# Altium footprint library komponenty_ITS_v1.PcbLib: 81 footprints (part 2 of 6)
Each footprint in its own frame and in the unit in brackets; x right, y up, seen from the top. Pads: shape width x height; smd on the part's side, far side on the other; paste and mask are expansions set on the pad; w line width, h text height; cw(c..) or ccw(c..) is an arc to the next point about the centre after c.
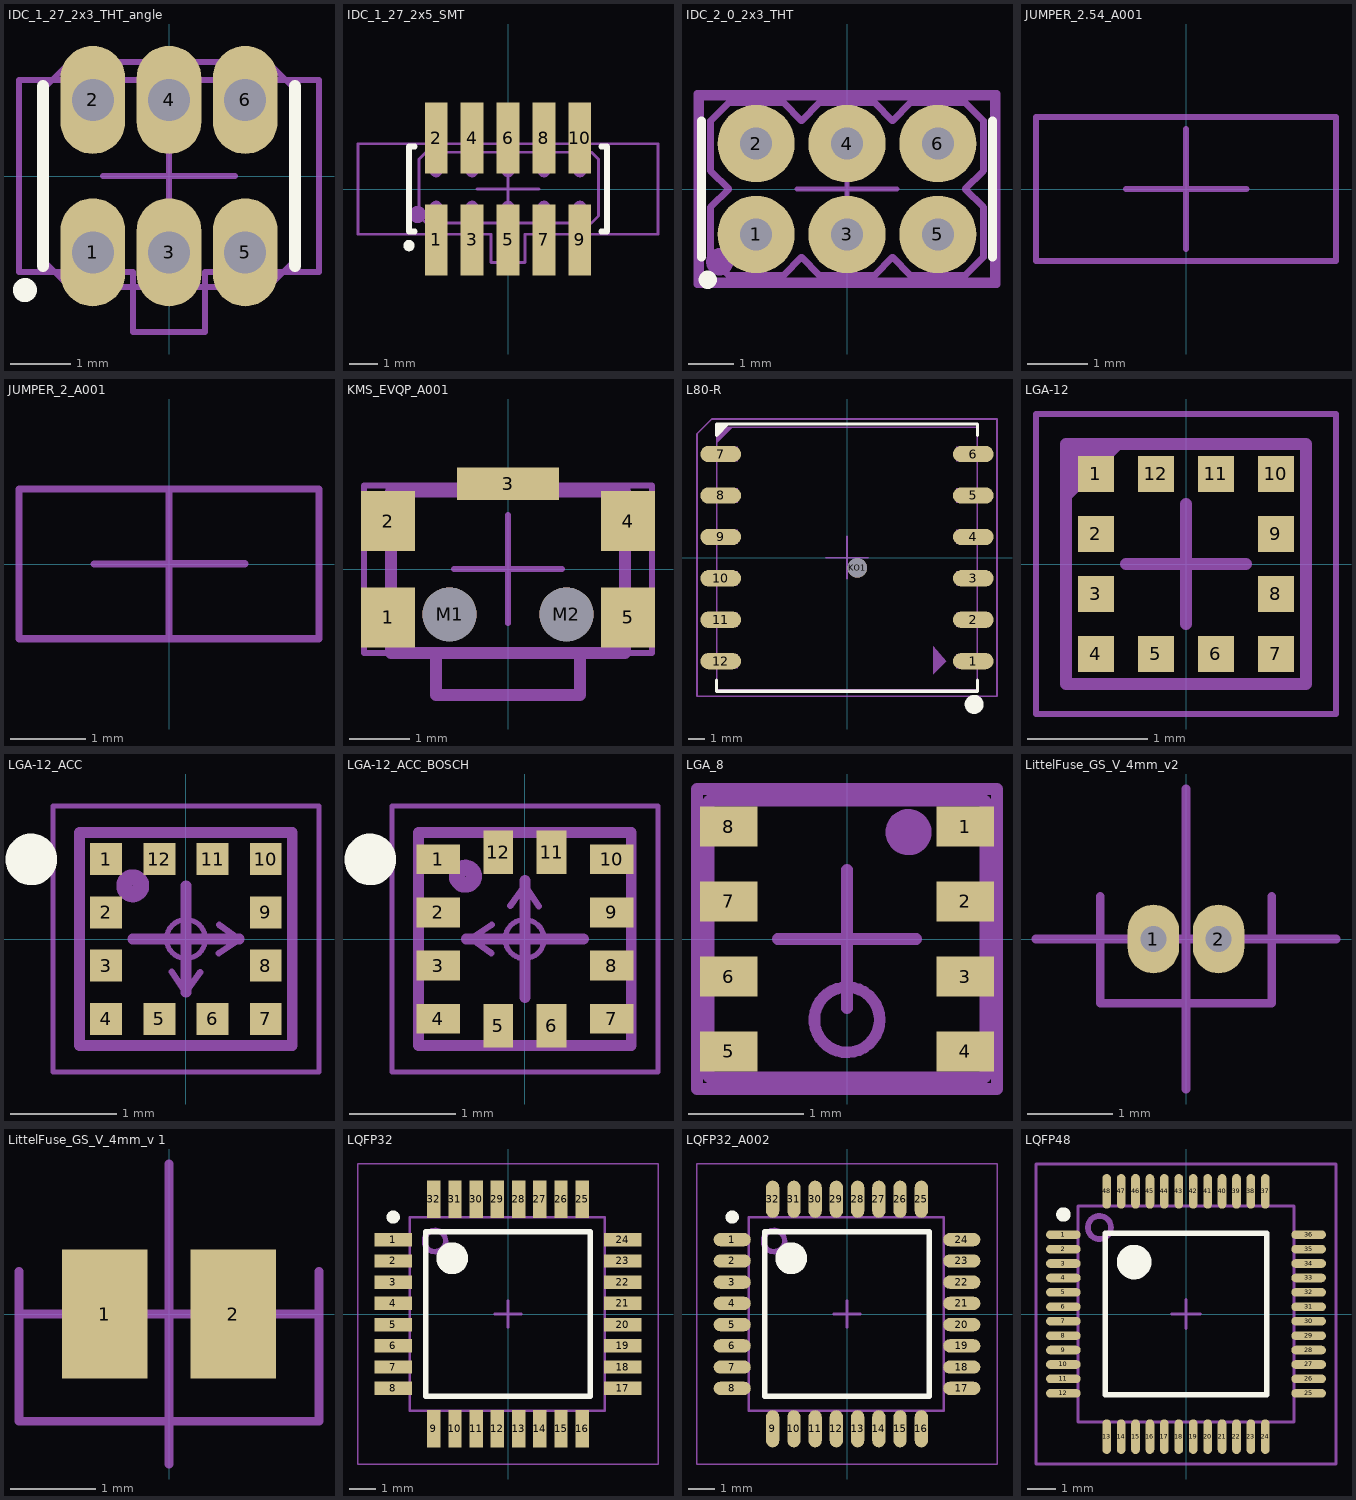
[diagram p1: the footprints below, top view; thin cyan lines are the x and y axes]

## IDC_1_27_2x3_THT_angle [mm] "IDC 2x3 1,27 mm THT angle"
pads (6):
  oval 1.08x1.8 hole 0.7: 1(-1.27,-1.27) 2(-1.27,1.27) 3(0,-1.27) 4(0,1.27) 5(1.27,-1.27) 6(1.27,1.27)
Top Overlay:
  circle w0.2: c-2.4,-1.9 r0.1
  lines w0.2: -2.1,-1.5 -2.1,1.5 ; 2.1,-1.5 2.1,1.5
M15_orgin:
  lines w0.1: -1.1,0 0,0 ; 0,-1.1 0,0 ; 0,1.1 0,0 ; 1.1,0 0,0 ; -2.5,-1.6 -2.5,1.6 2.5,1.6 2.5,-1.6 0.6,-1.6 0.6,-2.6 -0.6,-2.6 -0.6,-1.6 -2.5,-1.6
Top M17-18_TDES:
  text "'.Designator'" at -5.665,-0.416 h1
Top M19-20_TMOT:
  circle w0.15: c0,1.27 r0.12
  circle w0.15: c0,-1.27 r0.12
  circle w0.15: c1.27,1.27 r0.12
  circle w0.15: c1.27,-1.27 r0.12
  circle w0.15: c-1.27,1.27 r0.12
  circle w0.15: c-1.27,-1.27 r0.12
  lines w0.1: -2.1,-1.4 -1.65,-1.85 1.65,-1.85 2.1,-1.4 2.1,1.45 1.65,1.9 -1.65,1.9 -2.1,1.45 -2.1,-1.4 ; -1.57,-1.47 -1.57,-1.07 -1.47,-0.97 -1.07,-0.97 -0.97,-1.07 -0.97,-1.47 -1.07,-1.57 -1.47,-1.57 -1.57,-1.47 ; -1.57,1.07 -1.57,1.47 -1.47,1.57 -1.07,1.57 -0.97,1.47 -0.97,1.07 -1.07,0.97 -1.47,0.97 -1.57,1.07 ; -0.3,-1.47 -0.3,-1.07 -0.2,-0.97 0.2,-0.97 0.3,-1.07 0.3,-1.47 0.2,-1.57 -0.2,-1.57 -0.3,-1.47 ; -0.3,1.07 -0.3,1.47 -0.2,1.57 0.2,1.57 0.3,1.47 0.3,1.07 0.2,0.97 -0.2,0.97 -0.3,1.07 ; 0.97,-1.47 0.97,-1.07 1.07,-0.97 1.47,-0.97 1.57,-1.07 1.57,-1.47 1.47,-1.57 1.07,-1.57 0.97,-1.47 ; 0.97,1.07 0.97,1.47 1.07,1.57 1.47,1.57 1.57,1.47 1.57,1.07 1.47,0.97 1.07,0.97 0.97,1.07

## IDC_1_27_2x5_SMT [mm] "IDC 2x5 1,27 mm SMT OEM"
pads (10):
  rect 0.8x2.5 smd: 1(-2.54,-1.8) 2(-2.54,1.8) 3(-1.27,-1.8) 4(-1.27,1.8) 5(0,-1.8) 6(0,1.8) 7(1.27,-1.8) 8(1.27,1.8) 9(2.54,-1.8) 10(2.54,1.8)
Top Overlay:
  circle w0.2: c-3.5,-2 r0.1
  lines w0.2: -3.3,-1.5 -3.5,-1.5 -3.5,1.5 -3.3,1.5 ; 3.3,-1.5 3.5,-1.5 3.5,1.5 3.3,1.5
Top M11-12_SMOT:
  circle w0.2: c-2.54,-0.635 r0.12
  circle w0.2: c-2.54,0.635 r0.12
  circle w0.2: c2.54,0.635 r0.12
  circle w0.2: c2.54,-0.635 r0.12
  circle w0.2: c0,0.635 r0.12
  circle w0.2: c0,-0.635 r0.12
  circle w0.2: c1.27,0.635 r0.12
  circle w0.2: c-1.27,0.635 r0.12
  circle w0.2: c-1.27,-0.635 r0.12
  circle w0.2: c1.27,-0.635 r0.12
  circle w0.4: c-3.2,-0.9 r0.1
  region: -2.322,-0.656 -2.759,-0.656 -2.759,-2.072 -2.322,-2.072
  rectangle: -2.758,0.656 -2.321,2.072
  rectangle: 2.322,0.656 2.759,2.072
  region: 2.758,-0.656 2.321,-0.656 2.321,-2.072 2.758,-2.072
  rectangle: -1.488,0.656 -1.051,2.072
  rectangle: -0.218,0.656 0.219,2.072
  rectangle: 1.052,0.656 1.489,2.072
  region: 1.488,-0.656 1.051,-0.656 1.051,-2.072 1.488,-2.072
  region: 0.218,-0.656 -0.219,-0.656 -0.219,-2.072 0.218,-2.072
  region: -1.052,-0.656 -1.489,-0.656 -1.489,-2.072 -1.052,-2.072
  lines w0.1: -3.15,-0.95 -2.9,-1.2 2.95,-1.2 3.2,-0.95 3.2,1.05 2.95,1.3 -2.9,1.3 -3.15,1.05 -3.15,-0.95
Top M13-14_SDES:
  text "'.Designator'" at -5.665,-0.416 h1
M15_orgin:
  lines w0.1: -1.1,0 0,0 ; 0,-1.1 0,0 ; 0,1.1 0,0 ; 1.1,0 0,0 ; -5.3,-1.6 -5.3,1.6 5.3,1.6 5.3,-1.6 0.6,-1.6 0.6,-2.6 -0.6,-2.6 -0.6,-1.6 -5.3,-1.6
3D body "1_27_2x5_62101021021 (rev1).stp": height 5.92, standoff 0.01, extent -3.175,-2.5 3.175,2.5

## IDC_2_0_2x3_THT [mm] "IDC 2x3 2mm THT"
pads (6):
  round 1.7 hole 0.7: 1(-2,-1) 2(-2,1) 3(0,-1) 4(0,1) 5(2,-1) 6(2,1)
Top Overlay:
  circle w0.2: c-3.064,-1.997 r0.1
  lines w0.2: -3.2,-1.5 -3.2,1.5 ; 3.2,-1.5 3.2,1.5
M15_orgin:
  lines w0.1: -1.1,0 0,0 ; 0,-1.1 0,0 ; 0,1.1 0,0 ; 1.1,0 0,0 ; -3.2,-2 0.6,-2 3.2,-2 3.2,2 -3.2,2 -3.2,-2
Top M17-18_TDES:
  text "'.Designator'" at -5.465,2.483 h1
Top M19-20_TMOT:
  circle w0.3: c-2.8,-1.6 r0.15
  lines w0.1: -2.4,-1.4 -1.6,-0.6 ; -2.4,-0.6 -1.6,-1.4 ; -2.4,0.6 -1.6,1.4 ; -2.4,1.4 -1.6,0.6 ; -0.4,-1.4 0.4,-0.6 ; -0.4,-0.6 0.4,-1.4 ; -0.4,0.6 0.4,1.4 ; -0.4,1.4 0.4,0.6 ; 1.6,-1.4 2.4,-0.6 ; 1.6,-0.6 2.4,-1.4 ; 1.6,0.6 2.4,1.4 ; 1.6,1.4 2.4,0.6
  lines w0.15: -3.3,-2.1 -3.3,2.1 3.3,2.1 3.3,-2.1 -3.3,-2.1 ; -3,-1.5 -2.6,-1.9 -1.4,-1.9 -1,-1.5 -0.6,-1.9 0.6,-1.9 1,-1.5 1.4,-1.9 2.6,-1.9 3,-1.5 3,-0.4 2.6,0 3,0.4 3,1.5 2.6,1.9 1.4,1.9 1,1.5 0.6,1.9 -0.6,1.9 -1,1.5 -1.4,1.9 -2.6,1.9 -3,1.5 -3,0.4 -2.6,0 -3,-0.4 -3,-1.5 ; -2.4,-1.4 -2.4,-0.6 -1.6,-0.6 -1.6,-1.4 -2.4,-1.4 ; -2.4,0.6 -2.4,1.4 -1.6,1.4 -1.6,0.6 -2.4,0.6 ; -0.4,-1.4 -0.4,-0.6 0.4,-0.6 0.4,-1.4 -0.4,-1.4 ; -0.4,0.6 -0.4,1.4 0.4,1.4 0.4,0.6 -0.4,0.6 ; 1.6,-1.4 1.6,-0.6 2.4,-0.6 2.4,-1.4 1.6,-1.4 ; 1.6,0.6 1.6,1.4 2.4,1.4 2.4,0.6 1.6,0.6
3D body "IDC_2x3_2mm_THT_v1c.STEP": height 6.15, standoff -2.55, extent -3,-2 3,2

## JUMPER_2.54_A001 [mm]
M15_orgin:
  lines w0.1: -1,0 0,0 ; 0,-1 0,0 ; 0,1 0,0 ; 0.009,0.004 1.009,0.004 ; -2.5,-1.2 -2.5,1.2 2.5,1.2 2.5,-1.2 -2.5,-1.2
3D body "pin_head_2_54mm_black.stp": height 8.99, standoff 3.01, extent -2.5,-1.22 2.5,1.22

## JUMPER_2_A001 [mm]
M15_orgin:
  lines w0.1: -1,0 0,0 ; 0,-1 0,0 ; 0,1 0,0 ; 0.009,0.004 1.009,0.004 ; -2,-0.999 -2,1 2,1 2,-0.999 -2,-0.999
3D body "jumper_2mm_60800213421.stp": height 5.95, standoff 2.45, extent -2.025,-0.95 2.025,0.95

## KMS_EVQP_A001 [mm] "microwsitch SMD angle"
pads (7):
  rect 0.9x1 smd mask+0.1: 1(-2,-0.8) 2(-2,0.8) 4(2,0.8) 5(2,-0.8)
  rect 1.7x0.55 smd mask+0.1: 3(0,1.425)
  round 0.9 hole 0.9 unplated mask+0.1: M1(-0.975,-0.75) M2(0.975,-0.75)
Top M11-12_SMOT:
  rectangle: 1.95,0.4 2.3,1.2
  rectangle: 1.95,-1.2 2.3,-0.4
  region: -1.95,-0.4 -2.3,-0.4 -2.3,-1.2 -1.95,-1.2
  region: -1.95,1.2 -2.3,1.2 -2.3,0.4 -1.95,0.4
  region: 0.6,1.3 0.6,1.55 -0.6,1.55 -0.6,1.3
  lines w0.2: -1.2,-1.4 -1.2,-2.1 1.2,-2.1 1.2,-1.4 ; -1.95,-1.4 1.95,-1.4 1.95,1.3 -1.95,1.3 -1.95,-1.4
Top M13-14_SDES:
  text "'.Designator'" at -4.532,-0.333 h0.8
M15_orgin:
  lines w0.1: -1.2,-1.4 -1.2,-2.1 1.2,-2.1 1.2,-1.4 ; -0.9,0 0,0 ; 0,-0.9 0,0 ; 0,0.9 0,0 ; 0.9,0 0,0 ; -2.4,-1.4 2.4,-1.4 2.4,1.4 -2.4,1.4 -2.4,-1.4
3D body "EVQP7-JA-01P_v2.step": height 1.36, standoff 0.01, extent -2.35,-2.1 2.35,1.45
3D body "KMS231G.X_T": height 1.43, standoff -0.01, extent -2.3,-2.15 2.3,1.4

## L80-R [mm]
pads (13):
  oval 2.5x1 smd mask+0.1: 1(7.75,-6.35) 2(7.75,-3.81) 3(7.75,-1.27) 4(7.75,1.27) 5(7.75,3.81) 6(7.75,6.35) 7(-7.75,6.35) 8(-7.75,3.81) 9(-7.75,1.27) 10(-7.75,-1.27) 11(-7.75,-3.81) 12(-7.75,-6.35)
  round 1.2 hole 1.2 unplated mask+0.1: KO1(0.63,-0.63)
Top Overlay:
  circle w0.6: c7.8,-9 r0.283
  region: -8,8.2 -7.3,8.2 -8,7.5
  lines w0.1: -7.3,8.2 -6.8,8.2
  lines w0.2: -8,-7.5 -8,-8.2 8,-8.2 8,-7.5 ; -7.3,8.2 -8,7.5 -8,8.2 8,8.2 8,7.5
Top M11-12_SMOT:
  rectangle: 6.7,5.9 8.2,6.8
  rectangle: 6.7,3.36 8.2,4.26
  rectangle: 6.7,-4.26 8.2,-3.36
  rectangle: 6.7,-6.8 8.2,-5.9
  rectangle: 6.7,0.82 8.2,1.72
  rectangle: 6.7,-1.72 8.2,-0.82
  region: -6.7,4.26 -8.2,4.26 -8.2,3.36 -6.7,3.36
  region: -6.7,6.8 -8.2,6.8 -8.2,5.9 -6.7,5.9
  region: -6.7,-5.9 -8.2,-5.9 -8.2,-6.8 -6.7,-6.8
  region: -6.7,-3.36 -8.2,-3.36 -8.2,-4.26 -6.7,-4.26
  region: -6.7,1.72 -8.2,1.72 -8.2,0.82 -6.7,0.82
  region: -6.7,-0.82 -8.2,-0.82 -8.2,-1.72 -6.7,-1.72
  region: 5.3,-5.45 5.3,-7.15 6.1,-6.35
  region: -8,8 -7,8 -8,7
  lines w0.1: -8,-8.1 8,-8.1 8,8 -8,8 -8,-8.1
Top M13-14_SDES:
  text "'.Designator'" at -0.583,7.931 h1.4
M15_orgin:
  lines w0.1: -1.3,0 0,0 ; 0,-1.3 0,0 ; 0,1.3 0,0 ; 1.3,0 0,0 ; -9.2,-8.5 -9.2,7.6 -8.3,8.5 9.2,8.5 9.2,-8.5 -9.2,-8.5
3D body: height 7.79, standoff -7.91, extent -0.4,3.2 -0.4,3.2
3D body "quectel-l80.step": height 6.96, standoff 0.01, extent -8,-8 8,8

## LGA-12 [mm] "LGA, 12-Leads, Body 2,00x2,00mmx0,70mm, Pitch 0,50mm"
height 0.7
pads (12):
  rect 0.3x0.3 smd mask+0.1: 1(-0.75,0.75) 2(-0.75,0.25) 3(-0.75,-0.25) 4(-0.75,-0.75) 5(-0.25,-0.75) 6(0.25,-0.75) 7(0.75,-0.75) 8(0.75,-0.25) 9(0.75,0.25) 10(0.75,0.75) 11(0.25,0.75) 12(-0.25,0.75)
Top Solder:
  rectangle: -1,0.5 1,1
  rectangle: 0.5,-0.7 1,0.7
  rectangle: -1,-1 1,-0.5
  rectangle: -1,-0.7 -0.5,0.7
Top M11-12_SMOT:
  rectangle: -0.35,0.65 -0.15,0.85
  rectangle: -0.85,0.65 -0.65,0.85
  rectangle: 0.15,0.65 0.35,0.85
  rectangle: 0.65,0.65 0.85,0.85
  rectangle: 0.65,0.15 0.85,0.35
  rectangle: -0.85,0.15 -0.65,0.35
  rectangle: -0.85,-0.35 -0.65,-0.15
  rectangle: 0.65,-0.35 0.85,-0.15
  rectangle: 0.65,-0.85 0.85,-0.65
  rectangle: 0.15,-0.85 0.35,-0.65
  rectangle: -0.35,-0.85 -0.15,-0.65
  rectangle: -0.85,-0.85 -0.65,-0.65
  region: -1,1 -0.5,1 -1,0.5
  lines w0.1: -1,-1 1,-1 1,1 -1,1 -1,-1
Top M13-14_SDES:
  text "'.Designator'" at -3.399,-0.25 h0.6
M15_orgin:
  lines w0.05: -1.25,-1.25 -1.25,1.25 1.25,1.25 1.25,-1.25 -1.25,-1.25
  lines w0.1: -0.5,0 0.5,0 ; 0,-0.5 0,0.5
3D body: height 0.7, standoff 0, extent -1,-1 1,1

## LGA-12_ACC [mm] "LGA, 12-Leads, Body 2,00x2,00mmx0,70mm, Pitch 0,50mm"
height 0.7
pads (12):
  rect 0.3x0.3 smd mask+0.1: 1(-0.75,0.75) 2(-0.75,0.25) 3(-0.75,-0.25) 4(-0.75,-0.75) 5(-0.25,-0.75) 6(0.25,-0.75) 7(0.75,-0.75) 8(0.75,-0.25) 9(0.75,0.25) 10(0.75,0.75) 11(0.25,0.75) 12(-0.25,0.75)
Top Overlay:
  circle w0.254: c-1.453,0.748 r0.115
Top Solder:
  rectangle: -1,0.5 1,1
  rectangle: 0.5,-0.7 1,0.7
  rectangle: -1,-1 1,-0.5
  rectangle: -1,-0.7 -0.5,0.7
Top M11-12_SMOT:
  circle w0.15: c-0.5,0.5 r0.08
  rectangle: -0.35,0.65 -0.15,0.85
  rectangle: -0.85,0.65 -0.65,0.85
  rectangle: 0.15,0.65 0.35,0.85
  rectangle: 0.65,0.65 0.85,0.85
  rectangle: 0.65,0.15 0.85,0.35
  rectangle: 0.65,-0.35 0.85,-0.15
  rectangle: -0.85,-0.35 -0.65,-0.15
  rectangle: -0.85,0.15 -0.65,0.35
  rectangle: -0.85,-0.85 -0.65,-0.65
  rectangle: -0.35,-0.85 -0.15,-0.65
  rectangle: 0.15,-0.85 0.35,-0.65
  rectangle: 0.65,-0.85 0.85,-0.65
  lines w0.1: -1,-1 1,-1 1,1 -1,1 -1,-1
Top M13-14_SDES:
  text "'.Designator'" at -3.399,-0.25 h0.6
M15_orgin:
  lines w0.05: -1.25,-1.25 -1.25,1.25 1.25,1.25 1.25,-1.25 -1.25,-1.25
  lines w0.1: -0.5,0 0,0 ; 0,-0.5 0,0 ; 0,0.5 0,0 ; 0.5,0 0,0
Mechanical 16:
  circle w0.05: c0,0 r0.182
  circle w0.05: c-0.001,-0.002 r0.047
  lines w0.06: -0.5,0 0.5,0 0.312,0.133 ; -0.135,-0.308 -0.002,-0.506 ; 0,0.5 0,-0.5 0.133,-0.312 ; 0.308,-0.135 0.506,-0.002
  text "Z+" at -0.465,0.116 h0.2
  text "X+" at 0.615,-0.097 h0.2
  text "Y+" at -0.062,-0.862 h0.2
3D body: height 0.7, standoff 0, extent -1,-1 1,1

## LGA-12_ACC_BOSCH [mm] "LGA, 12-Leads, Body 2,00x2,00mmx0,70mm, Pitch 0,50mm"
height 0.7
pads (12):
  rect 0.41x0.28 smd mask+0.1: 1(-0.815,0.75) 2(-0.815,0.25) 3(-0.815,-0.25) 4(-0.815,-0.75) 7(0.815,-0.75) 8(0.815,-0.25) 9(0.815,0.25) 10(0.815,0.75)
  rect 0.28x0.41 smd mask+0.1: 5(-0.25,-0.815) 6(0.25,-0.815) 11(0.25,0.815) 12(-0.25,0.815)
Top Overlay:
  circle w0.254: c-1.453,0.748 r0.115
Top Solder:
  rectangle: -0.112,-1.118 0.2,-0.95
  rectangle: -0.119,0.9 0.15,1.119
  rectangle: -1.116,-0.991 -0.503,0.99
  rectangle: -0.65,0.5 1.119,0.989
  rectangle: 0.5,-0.999 1.117,0.988
  rectangle: -1,-1 1,-0.5
  rectangle: -1,-0.7 -0.5,0.7
Top M11-12_SMOT:
  circle w0.15: c-0.56,0.59 r0.08
  region: -0.2,-0.7 -0.3,-0.7 -0.3,-0.9 -0.2,-0.9
  region: 0.3,-0.7 0.2,-0.7 0.2,-0.9 0.3,-0.9
  region: 0.7,0.8 0.7,0.7 0.9,0.7 0.9,0.8
  region: 0.7,0.3 0.7,0.2 0.9,0.2 0.9,0.3
  region: 0.7,-0.2 0.7,-0.3 0.9,-0.3 0.9,-0.2
  region: 0.7,-0.7 0.7,-0.8 0.9,-0.8 0.9,-0.7
  region: -0.7,-0.8 -0.7,-0.7 -0.9,-0.7 -0.9,-0.8
  region: -0.7,-0.3 -0.7,-0.2 -0.9,-0.2 -0.9,-0.3
  region: -0.7,0.2 -0.7,0.3 -0.9,0.3 -0.9,0.2
  region: -0.7,0.7 -0.7,0.8 -0.9,0.8 -0.9,0.7
  rectangle: 0.2,0.7 0.3,0.9
  rectangle: -0.3,0.7 -0.2,0.9
  lines w0.1: -1,-1 -1,1 1,1 1,-1 -1,-1
Top M13-14_SDES:
  text "'.Designator'" at -3.399,-0.25 h0.6
M15_orgin:
  lines w0.05: -1.25,-1.25 -1.25,1.25 1.25,1.25 1.25,-1.25 -1.25,-1.25
  lines w0.1: -0.55,0 0,0 ; 0,-0.55 0,0 ; 0,0.55 0,0 ; 0.55,0 0,0
Mechanical 16:
  circle w0.05: c-0.003,0 r0.182
  circle w0.05: c-0.001,-0.001 r0.047
  lines w0.06: -0.509,0.002 -0.312,0.134 ; -0.315,-0.134 -0.503,0 0.497,0 ; -0.137,0.311 -0.003,0.5 -0.003,-0.5 ; -0.001,0.505 0.131,0.308
  text "X+" at 0.094,0.614 h0.2
  text "Y+" at -0.601,-0.167 h0.2
  text "Z+" at -0.119,-0.466 h0.2
3D body: height 0.7, standoff 0, extent -1,-1 1,1

## LGA_8 [mm] "BME280 bosh"
pads (8):
  rect 0.5x0.35 smd: 1(1.025,0.975) 2(1.025,0.325) 3(1.025,-0.325) 4(1.025,-0.975) 5(-1.025,-0.975) 6(-1.025,-0.325) 7(-1.025,0.325) 8(-1.025,0.975)
Top M11-12_SMOT:
  circle w0.1: c0,-0.7 r0.283
  circle w0.2: c0.533,0.926 r0.1
  region: 1.2,1.099 0.808,1.099 0.808,0.85 1.2,0.85
  region: 1.2,0.449 0.808,0.449 0.808,0.2 1.2,0.2
  region: 1.2,-0.201 0.808,-0.201 0.808,-0.45 1.2,-0.45
  region: 1.2,-0.851 0.808,-0.851 0.808,-1.1 1.2,-1.1
  rectangle: -1.2,0.201 -0.808,0.45
  rectangle: -1.2,0.851 -0.808,1.1
  rectangle: -1.2,-1.099 -0.808,-0.85
  rectangle: -1.2,-0.449 -0.808,-0.2
  lines w0.1: -1.2,-1.2 1.2,-1.2 1.2,1.2 -1.2,1.2 -1.2,-1.2
Top M13-14_SDES:
  text "'.Designator'" at 0.25,-3.399 h0.6
M15_orgin:
  lines w0.1: -0.6,0 0,0 ; 0,-0.6 0,0 ; 0,0.6 0,0 ; 0.6,0 0,0 ; -1.3,-1.3 -0.9,-1.3 1.3,-1.3 1.3,1.3 -1.3,1.3 -1.3,-1.3
3D body "Bosch_BME280.step": height 0.94, standoff 0.01, extent -1.25,-1.25 1.25,1.25

## LittelFuse_GS_V_4mm_v2 [mm] "NTC glass drop"
pads (2):
  oval 0.6x0.8 hole 0.3: 1(-0.38,0) 2(0.38,0)
M15_orgin:
  lines w0.1: -1.75,0 0,0 ; 0,-1.75 0,0 ; 0,1.75 0,0 ; 1.75,0 0,0
Top M17-18_TDES:
  text "'.Designator'" at -5.715,1.433 h1
Top M19-20_TMOT:
  lines w0.1: -1,0.5 -1,-0.75 1,-0.75 1,0.5
3D body "littelfuse_GS_v3.STEP": height 0.91, standoff -2.35, extent -0.762,-0.138 0.762,5.762

## LittelFuse_GS_V_4mm_v 1 [mm] "NTC glass drop"
pads (2):
  rect 1x1.5 smd: 1(-0.75,0) 2(0.75,0)
M15_orgin:
  lines w0.1: -1.75,0 0,0 ; 0,-1.75 0,0 ; 0,1.75 0,0 ; 1.75,0 0,0
Top M17-18_TDES:
  text "'.Designator'" at -5.715,1.433 h1
Top M19-20_TMOT:
  lines w0.1: -1.75,0.5 -1.75,-1.25 1.75,-1.25 1.75,0.5
3D body "littelfuse_GS_v2.STEP": height 0.56, standoff -0.96, extent -0.762,-0.667 0.762,5.762

## LQFP32 [mm] "TQFP, 32-Leads, Body 7,00x7,00mm, Pitch 0,80mm, IPC Low Density"
height 1.6
pads (32):
  rect 1.4x0.5 smd: 1(-4.325,2.8) 2(-4.325,2) 3(-4.325,1.2) 4(-4.325,0.4) 5(-4.325,-0.4) 6(-4.325,-1.2) 7(-4.325,-2) 8(-4.325,-2.8) 17(4.325,-2.8) 18(4.325,-2) 19(4.325,-1.2) 20(4.325,-0.4) 21(4.325,0.4) 22(4.325,1.2) 23(4.325,2) 24(4.325,2.8)
  rect 0.5x1.4 smd: 9(-2.8,-4.325) 10(-2,-4.325) 11(-1.2,-4.325) 12(-0.4,-4.325) 13(0.4,-4.325) 14(1.2,-4.325) 15(2,-4.325) 16(2.8,-4.325) 25(2.8,4.325) 26(2,4.325) 27(1.2,4.325) 28(0.4,4.325) 29(-0.4,4.325) 30(-1.2,4.325) 31(-2,4.325) 32(-2.8,4.325)
Top Overlay:
  circle w0.25: c-4.325,3.65 r0.125
  circle w0.6: c-2.1,2.1 r0.3
  lines w0.2: -3.1,-3.1 -3.1,3.1 3.1,3.1 3.1,-3.1 -3.1,-3.1
Top M11-12_SMOT:
  circle w0.2: c-2.75,2.75 r0.4
  region: -3.65,2.65 -3.65,2.95 -4.45,2.95 -4.45,2.65
  region: -3.65,1.85 -3.65,2.15 -4.45,2.15 -4.45,1.85
  region: -3.65,1.05 -3.65,1.35 -4.45,1.35 -4.45,1.05
  region: -3.65,0.25 -3.65,0.55 -4.45,0.55 -4.45,0.25
  region: -3.65,-0.55 -3.65,-0.25 -4.45,-0.25 -4.45,-0.55
  region: -3.65,-1.35 -3.65,-1.05 -4.45,-1.05 -4.45,-1.35
  region: -3.65,-2.15 -3.65,-1.85 -4.45,-1.85 -4.45,-2.15
  region: -3.65,-2.95 -3.65,-2.65 -4.45,-2.65 -4.45,-2.95
  region: -2.65,-3.65 -2.95,-3.65 -2.95,-4.45 -2.65,-4.45
  region: -1.85,-3.65 -2.15,-3.65 -2.15,-4.45 -1.85,-4.45
  region: -1.05,-3.65 -1.35,-3.65 -1.35,-4.45 -1.05,-4.45
  region: -0.25,-3.65 -0.55,-3.65 -0.55,-4.45 -0.25,-4.45
  region: 0.55,-3.65 0.25,-3.65 0.25,-4.45 0.55,-4.45
  region: 1.35,-3.65 1.05,-3.65 1.05,-4.45 1.35,-4.45
  region: 2.15,-3.65 1.85,-3.65 1.85,-4.45 2.15,-4.45
  region: 2.95,-3.65 2.65,-3.65 2.65,-4.45 2.95,-4.45
  region: 3.65,-2.65 3.65,-2.95 4.45,-2.95 4.45,-2.65
  region: 3.65,-1.85 3.65,-2.15 4.45,-2.15 4.45,-1.85
  region: 3.65,-1.05 3.65,-1.35 4.45,-1.35 4.45,-1.05
  region: 3.65,-0.25 3.65,-0.55 4.45,-0.55 4.45,-0.25
  region: 3.65,0.55 3.65,0.25 4.45,0.25 4.45,0.55
  region: 3.65,1.35 3.65,1.05 4.45,1.05 4.45,1.35
  region: 3.65,2.15 3.65,1.85 4.45,1.85 4.45,2.15
  region: 3.65,2.95 3.65,2.65 4.45,2.65 4.45,2.95
  rectangle: 2.65,3.65 2.95,4.45
  rectangle: 1.85,3.65 2.15,4.45
  rectangle: 1.05,3.65 1.35,4.45
  rectangle: 0.25,3.65 0.55,4.45
  rectangle: -0.55,3.65 -0.25,4.45
  rectangle: -1.35,3.65 -1.05,4.45
  rectangle: -2.15,3.65 -1.85,4.45
  rectangle: -2.95,3.65 -2.65,4.45
  lines w0.1: -3.7,-3.65 3.65,-3.65 3.65,3.65 -3.7,3.65 -3.7,-3.65
Top M13-14_SDES:
  text "'.Designator'" at -5.665,-0.417 h1
M15_orgin:
  lines w0.05: -5.65,-5.65 -5.65,5.65 5.65,5.65 5.65,-5.65 -5.65,-5.65
  lines w0.1: -0.5,0 0.5,0 ; 0,-0.5 0,0.5
3D body "LQFP32.step": height 1.6, standoff 0, extent -4.3,-4.3 4.3,4.3

## LQFP32_A002 [mm] "TQFP, 32-Leads, Body 7,00x7,00mm, Pitch 0,80mm, IPC Low Density"
height 1.6
pads (32):
  oval 1.4x0.5 smd: 1(-4.325,2.8) 2(-4.325,2) 3(-4.325,1.2) 4(-4.325,0.4) 5(-4.325,-0.4) 6(-4.325,-1.2) 7(-4.325,-2) 8(-4.325,-2.8) 17(4.325,-2.8) 18(4.325,-2) 19(4.325,-1.2) 20(4.325,-0.4) 21(4.325,0.4) 22(4.325,1.2) 23(4.325,2) 24(4.325,2.8)
  oval 0.5x1.4 smd: 9(-2.8,-4.325) 10(-2,-4.325) 11(-1.2,-4.325) 12(-0.4,-4.325) 13(0.4,-4.325) 14(1.2,-4.325) 15(2,-4.325) 16(2.8,-4.325) 25(2.8,4.325) 26(2,4.325) 27(1.2,4.325) 28(0.4,4.325) 29(-0.4,4.325) 30(-1.2,4.325) 31(-2,4.325) 32(-2.8,4.325)
Top Overlay:
  circle w0.6: c-2.1,2.1 r0.3
  circle w0.25: c-4.325,3.65 r0.125
  lines w0.2: -3.1,-3.1 3.1,-3.1 3.1,3.1 -3.1,3.1 -3.1,-3.1
Top M11-12_SMOT:
  circle w0.2: c-2.75,2.75 r0.4
  region: -3.65,2.65 -3.65,2.95 -4.45,2.95 -4.45,2.65
  region: -3.65,1.85 -3.65,2.15 -4.45,2.15 -4.45,1.85
  region: -3.65,1.05 -3.65,1.35 -4.45,1.35 -4.45,1.05
  region: -3.65,0.25 -3.65,0.55 -4.45,0.55 -4.45,0.25
  region: -3.65,-0.55 -3.65,-0.25 -4.45,-0.25 -4.45,-0.55
  region: -3.65,-1.35 -3.65,-1.05 -4.45,-1.05 -4.45,-1.35
  region: -3.65,-2.15 -3.65,-1.85 -4.45,-1.85 -4.45,-2.15
  region: -3.65,-2.95 -3.65,-2.65 -4.45,-2.65 -4.45,-2.95
  region: -2.65,-3.65 -2.95,-3.65 -2.95,-4.45 -2.65,-4.45
  region: -1.85,-3.65 -2.15,-3.65 -2.15,-4.45 -1.85,-4.45
  region: -1.05,-3.65 -1.35,-3.65 -1.35,-4.45 -1.05,-4.45
  region: -0.25,-3.65 -0.55,-3.65 -0.55,-4.45 -0.25,-4.45
  region: 0.55,-3.65 0.25,-3.65 0.25,-4.45 0.55,-4.45
  region: 1.35,-3.65 1.05,-3.65 1.05,-4.45 1.35,-4.45
  region: 2.15,-3.65 1.85,-3.65 1.85,-4.45 2.15,-4.45
  region: 2.95,-3.65 2.65,-3.65 2.65,-4.45 2.95,-4.45
  region: 3.65,-2.65 3.65,-2.95 4.45,-2.95 4.45,-2.65
  region: 3.65,-1.85 3.65,-2.15 4.45,-2.15 4.45,-1.85
  region: 3.65,-1.05 3.65,-1.35 4.45,-1.35 4.45,-1.05
  region: 3.65,-0.25 3.65,-0.55 4.45,-0.55 4.45,-0.25
  region: 3.65,0.55 3.65,0.25 4.45,0.25 4.45,0.55
  region: 3.65,1.35 3.65,1.05 4.45,1.05 4.45,1.35
  region: 3.65,2.15 3.65,1.85 4.45,1.85 4.45,2.15
  region: 3.65,2.95 3.65,2.65 4.45,2.65 4.45,2.95
  rectangle: 2.65,3.65 2.95,4.45
  rectangle: 1.85,3.65 2.15,4.45
  rectangle: 1.05,3.65 1.35,4.45
  rectangle: 0.25,3.65 0.55,4.45
  rectangle: -0.55,3.65 -0.25,4.45
  rectangle: -1.35,3.65 -1.05,4.45
  rectangle: -2.15,3.65 -1.85,4.45
  rectangle: -2.95,3.65 -2.65,4.45
  lines w0.1: -3.7,-3.65 3.65,-3.65 3.65,3.65 -3.7,3.65 -3.7,-3.65
Top M13-14_SDES:
  text "'.Designator'" at -5.665,-0.417 h1
M15_orgin:
  lines w0.05: -5.65,-5.65 5.65,-5.65 5.65,5.65 -5.65,5.65 -5.65,-5.65
  lines w0.1: -0.5,0 0.5,0 ; 0,-0.5 0,0.5
3D body "LQFP32.step": height 1.6, standoff 0, extent -4.3,-4.3 4.3,4.3

## LQFP48 [mm]
height 1.6
pads (48):
  oval 1.2x0.3 smd: 1(-4.25,2.75) 2(-4.25,2.25) 3(-4.25,1.75) 4(-4.25,1.25) 5(-4.25,0.75) 6(-4.25,0.25) 7(-4.25,-0.25) 8(-4.25,-0.75) 9(-4.25,-1.25) 10(-4.25,-1.75) 11(-4.25,-2.25) 12(-4.25,-2.75) 25(4.25,-2.75) 26(4.25,-2.25) 27(4.25,-1.75) 28(4.25,-1.25) 29(4.25,-0.75) 30(4.25,-0.25) 31(4.25,0.25) 32(4.25,0.75) 33(4.25,1.25) 34(4.25,1.75) 35(4.25,2.25) 36(4.25,2.75)
  oval 0.3x1.2 smd: 13(-2.75,-4.25) 14(-2.25,-4.25) 15(-1.75,-4.25) 16(-1.25,-4.25) 17(-0.75,-4.25) 18(-0.25,-4.25) 19(0.25,-4.25) 20(0.75,-4.25) 21(1.25,-4.25) 22(1.75,-4.25) 23(2.25,-4.25) 24(2.75,-4.25) 37(2.75,4.25) 38(2.25,4.25) 39(1.75,4.25) 40(1.25,4.25) 41(0.75,4.25) 42(0.25,4.25) 43(-0.25,4.25) 44(-0.75,4.25) 45(-1.25,4.25) 46(-1.75,4.25) 47(-2.25,4.25) 48(-2.75,4.25)
Top Overlay:
  circle w0.6: c-1.8,1.8 r0.3
  circle w0.25: c-4.25,3.45 r0.125
  lines w0.2: -2.8,-2.8 2.8,-2.8 2.8,2.8 -2.8,2.8 -2.8,-2.8
Top M11-12_SMOT:
  circle w0.2: c-3,3 r0.4
  region: -3.75,2.65 -3.75,2.85 -4.6,2.85 -4.6,2.65
  region: -3.75,2.15 -3.75,2.35 -4.6,2.35 -4.6,2.15
  region: -3.75,1.65 -3.75,1.85 -4.6,1.85 -4.6,1.65
  region: -3.75,1.15 -3.75,1.35 -4.6,1.35 -4.6,1.15
  region: -3.75,0.65 -3.75,0.85 -4.6,0.85 -4.6,0.65
  region: -3.75,0.15 -3.75,0.35 -4.6,0.35 -4.6,0.15
  region: -3.75,-0.35 -3.75,-0.15 -4.6,-0.15 -4.6,-0.35
  region: -3.75,-0.85 -3.75,-0.65 -4.6,-0.65 -4.6,-0.85
  region: -3.75,-1.35 -3.75,-1.15 -4.6,-1.15 -4.6,-1.35
  region: -3.75,-1.85 -3.75,-1.65 -4.6,-1.65 -4.6,-1.85
  region: -3.75,-2.35 -3.75,-2.15 -4.6,-2.15 -4.6,-2.35
  region: -3.75,-2.85 -3.75,-2.65 -4.6,-2.65 -4.6,-2.85
  region: -2.65,-3.75 -2.85,-3.75 -2.85,-4.6 -2.65,-4.6
  region: -2.15,-3.75 -2.35,-3.75 -2.35,-4.6 -2.15,-4.6
  region: -1.65,-3.75 -1.85,-3.75 -1.85,-4.6 -1.65,-4.6
  region: -1.15,-3.75 -1.35,-3.75 -1.35,-4.6 -1.15,-4.6
  region: -0.65,-3.75 -0.85,-3.75 -0.85,-4.6 -0.65,-4.6
  region: -0.15,-3.75 -0.35,-3.75 -0.35,-4.6 -0.15,-4.6
  region: 0.35,-3.75 0.15,-3.75 0.15,-4.6 0.35,-4.6
  region: 0.85,-3.75 0.65,-3.75 0.65,-4.6 0.85,-4.6
  region: 1.35,-3.75 1.15,-3.75 1.15,-4.6 1.35,-4.6
  region: 1.85,-3.75 1.65,-3.75 1.65,-4.6 1.85,-4.6
  region: 2.35,-3.75 2.15,-3.75 2.15,-4.6 2.35,-4.6
  region: 2.85,-3.75 2.65,-3.75 2.65,-4.6 2.85,-4.6
  region: 3.75,-2.65 3.75,-2.85 4.6,-2.85 4.6,-2.65
  region: 3.75,-2.15 3.75,-2.35 4.6,-2.35 4.6,-2.15
  region: 3.75,-1.65 3.75,-1.85 4.6,-1.85 4.6,-1.65
  region: 3.75,-1.15 3.75,-1.35 4.6,-1.35 4.6,-1.15
  region: 3.75,-0.65 3.75,-0.85 4.6,-0.85 4.6,-0.65
  region: 3.75,-0.15 3.75,-0.35 4.6,-0.35 4.6,-0.15
  region: 3.75,0.35 3.75,0.15 4.6,0.15 4.6,0.35
  region: 3.75,0.85 3.75,0.65 4.6,0.65 4.6,0.85
  region: 3.75,1.35 3.75,1.15 4.6,1.15 4.6,1.35
  region: 3.75,1.85 3.75,1.65 4.6,1.65 4.6,1.85
  region: 3.75,2.35 3.75,2.15 4.6,2.15 4.6,2.35
  region: 3.75,2.85 3.75,2.65 4.6,2.65 4.6,2.85
  rectangle: 2.65,3.75 2.85,4.6
  rectangle: 2.15,3.75 2.35,4.6
  rectangle: 1.65,3.75 1.85,4.6
  rectangle: 1.15,3.75 1.35,4.6
  rectangle: 0.65,3.75 0.85,4.6
  rectangle: 0.15,3.75 0.35,4.6
  rectangle: -0.35,3.75 -0.15,4.6
  rectangle: -0.85,3.75 -0.65,4.6
  rectangle: -1.35,3.75 -1.15,4.6
  rectangle: -1.85,3.75 -1.65,4.6
  rectangle: -2.35,3.75 -2.15,4.6
  rectangle: -2.85,3.75 -2.65,4.6
  lines w0.1: -3.75,-3.75 3.75,-3.75 3.75,3.75 -3.75,3.75 -3.75,-3.75
Top M13-14_SDES:
  text "'.Designator'" at -6.798,-0.5 h1.2
M15_orgin:
  lines w0.1: -0.5,0 0.5,0 ; 0,-0.5 0,0.5 ; -5.2,-5.2 5.2,-5.2 5.2,5.2 -5.2,5.2 -5.2,-5.2
3D body "LQFP-48.stp": height 1.56, standoff 0, extent -4.5,-4.529 4.5,4.47